# Altium footprint library Hydra_Ref_pcb.PcbLib: 353 footprints (part 20 of 23)
Each footprint in its own frame and in the unit in brackets; x right, y up, seen from the top. Pads: shape width x height; smd on the part's side, far side on the other; paste and mask are expansions set on the pad; w line width, h text height; cw(c..) or ccw(c..) is an arc to the next point about the centre after c.
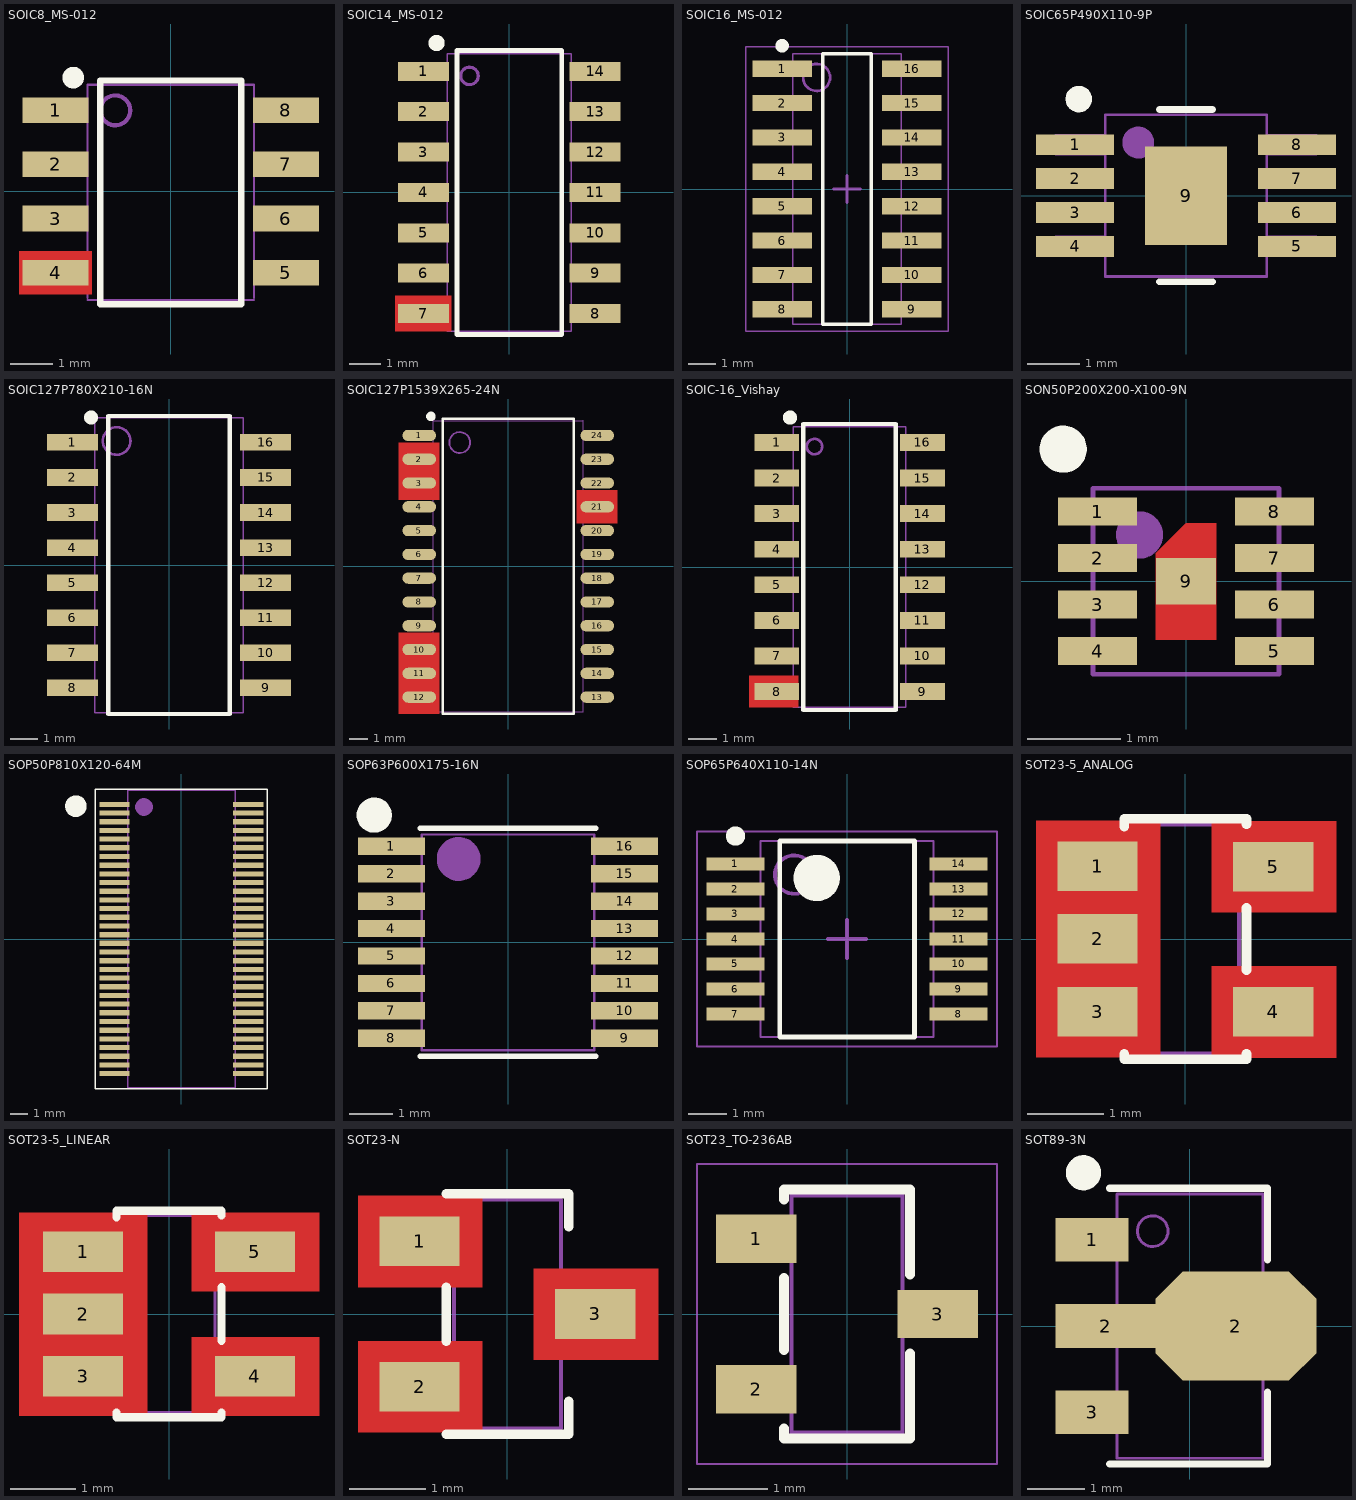
[diagram p19: the footprints below, top view; thin cyan lines are the x and y axes]

## SOIC8_MS-012 [mm] "SOP, 8-Leads, Body 3.9x4.9mm, Pitch 1.27mm, IPC Medium Density"
height 1.8
pads (8):
  rect 1.55x0.6 smd: 1(-2.7,1.905) 2(-2.7,0.635) 3(-2.7,-0.635) 4(-2.7,-1.905) 5(2.7,-1.905) 6(2.7,-0.635) 7(2.7,0.635) 8(2.7,1.905)
Top Layer:
  pour cut-out: -3.556,-2.413 -3.556,-1.397 -1.854,-1.397 -1.854,-2.413
Top Overlay:
  circle w0.254: c-2.286,2.667 r0.127
  lines w0.152: -1.65,-2.647 1.65,-2.647 ; 1.65,-2.6 1.65,2.6 -1.65,2.6 ; -1.65,2.6 -1.65,-2.6 -1.65,2.6
9 Top Assy:
  circle w0.1: c-1.3,1.9 r0.35
  lines w0.051: -1.95,-2.547 1.95,-2.547 ; -1.95,-2.5 -1.95,2.5 1.95,2.5 1.95,-2.5
  text ".Designator" at 0.254,-1.905 h0.76
3D body: height 1.8, standoff 0, extent -1.95,-2.547 1.95,2.5

## SOIC14_MS-012 [mm] "SOP, 14-Leads, Body 3.91x8.65mm, Pitch 1.27mm, IPC Medium Density"
height 1.8
pads (14):
  rect 1.6x0.6 smd: 1(-2.7,3.81) 2(-2.7,2.54) 3(-2.7,1.27) 4(-2.7,0) 5(-2.7,-1.27) 6(-2.7,-2.54) 7(-2.7,-3.81) 8(2.7,-3.81) 9(2.7,-2.54) 10(2.7,-1.27) 11(2.7,0) 12(2.7,1.27) 13(2.7,2.54) 14(2.7,3.81)
Top Layer:
  pour cut-out: -3.581,-4.369 -3.581,-3.251 -1.829,-3.251 -1.829,-4.369
Top Overlay:
  circle w0.254: c-2.286,4.699 r0.127
  lines w0.152: -1.65,-4.465 1.65,-4.465 1.65,4.465 -1.65,4.465 -1.65,-4.465
9 Top Assy:
  circle w0.1: c-1.25,3.665 r0.275
  lines w0.051: -1.95,-4.365 1.95,-4.365 1.95,4.365 -1.95,4.365 -1.95,-4.365
  text ".Designator" at 0.254,-3.429 h0.76
3D body: height 1.8, standoff 0, extent -1.95,-4.365 1.95,4.365

## SOIC16_MS-012 [mm] "SOIC127P600X175-16N, 16-Leads, Body 9.90x3.90mm, Pitch 1.27mm, IPC Medium Density"
height 1.76
pads (16):
  rect 2.2x0.6 smd: 1(-2.4,4.445) 2(-2.4,3.175) 3(-2.4,1.905) 4(-2.4,0.635) 5(-2.4,-0.635) 6(-2.4,-1.905) 7(-2.4,-3.175) 8(-2.4,-4.445) 9(2.4,-4.445) 10(2.4,-3.175) 11(2.4,-1.905) 12(2.4,-0.635) 13(2.4,0.635) 14(2.4,1.905) 15(2.4,3.175) 16(2.4,4.445)
Top Overlay:
  circle w0.25: c-2.4,5.295 r0.125
  lines w0.127: -0.9,-5 0.9,-5 0.9,5 -0.9,5 -0.9,-5
9 Top Assy:
  circle w0.1: c-1.125,4.125 r0.5
  lines w0.051: -2,-5 2,-5 2,5 -2,5 -2,-5
  text ".Designator" at 0.305,-3.734 h0.76
15 Top Optical Placement:
  lines w0.051: -3.75,-5.25 3.75,-5.25 3.75,5.25 -3.75,5.25 -3.75,-5.25
  lines w0.1: -0.5,0 0.5,0 ; 0,-0.5 0,0.5
3D body: height 1.76, standoff 0.1, extent -2,-5 2,5

## SOIC65P490X110-9P [mm] "SOIC, 8+1 Leads, Body 3x3mm (nominal), Pitch .65mm, IPC Medium Density"
height 1.1
pads (9):
  rect 1.498x0.4 smd mask+0.076: 1(-2.125,0.975) 2(-2.125,0.325) 3(-2.125,-0.325) 4(-2.125,-0.975) 5(2.125,-0.975) 6(2.125,-0.325) 7(2.125,0.325) 8(2.125,0.975)
  rect 1.57x1.89 smd mask+0.076: 9(0,0)
Top Overlay:
  circle w0.254: c-2.054,1.85 r0.127
  lines w0.127: -0.508,-1.651 0.508,-1.651 ; -0.508,1.651 0.508,1.651
9 Top Assy:
  circle w0.305: c-0.914,1.016 r0.152
  lines w0.025: -1.803,-0.783 -1.802,-0.783 -1.802,-1.163 ; -1.803,-0.133 -1.802,-0.133 -1.802,-0.513 ; -1.803,0.517 -1.802,0.517 -1.802,0.137 ; -1.803,1.167 -1.802,1.167 -1.802,0.787 ; -1.55,-1.163 -2.502,-1.163 -2.502,-0.783 -1.55,-0.783 ; -1.55,-0.513 -2.502,-0.513 -2.502,-0.133 -1.55,-0.133 ; -1.55,0.137 -2.502,0.137 -2.502,0.517 -1.55,0.517 ; -1.55,0.787 -2.502,0.787 -2.502,1.167 -1.55,1.167 ; 1.55,-1.163 2.502,-1.163 2.502,-0.783 1.55,-0.783 ; 1.55,-0.513 2.502,-0.513 2.502,-0.133 1.55,-0.133 ; 1.55,0.137 2.502,0.137 2.502,0.517 1.55,0.517 ; 1.55,0.787 2.502,0.787 2.502,1.167 1.55,1.167 ; 1.802,-1.163 1.802,-0.783 1.803,-0.783 ; 1.802,-0.513 1.802,-0.133 1.803,-0.133 ; 1.802,0.137 1.802,0.517 1.803,0.517 ; 1.802,0.787 1.802,1.167 1.803,1.167
  lines w0.05: -1.55,-1.55 1.55,-1.55 1.55,1.55 -1.55,1.55 -1.55,-1.55
  text ".Designator" at 0.381,-1.397 h0.64
3D body: height 1, standoff 0.15, extent -1.551,-1.55 1.567,1.55

## SOIC127P780X210-16N [mm] "SOP, 16-Leads, Body 10.1x5.3mm, Pitch 1.27mm, IPC Medium Density    SOP, 16-Leads, Body 10.1x5.3mm, Pitch 1.27mm, IPC Medium Density"
height 2.1
pads (16):
  rect 1.85x0.6 smd: 1(-3.5,4.445) 2(-3.5,3.175) 3(-3.5,1.905) 4(-3.5,0.635) 5(-3.5,-0.635) 6(-3.5,-1.905) 7(-3.5,-3.175) 8(-3.5,-4.445) 9(3.5,-4.445) 10(3.5,-3.175) 11(3.5,-1.905) 12(3.5,-0.635) 13(3.5,0.635) 14(3.5,1.905) 15(3.5,3.175) 16(3.5,4.445)
Top Overlay:
  circle w0.254: c-2.827,5.35 r0.127
  lines w0.152: -2.2,-5.4 -2.2,5.4 2.2,5.4 2.2,-5.4 -2.2,-5.4
9 Top Assy:
  circle w0.1: c-1.9,4.5 r0.5
  lines w0.051: -2.7,-5.35 -2.7,5.35 2.7,5.35 2.7,-5.35 -2.7,-5.35
  text ".Designator" at 0.127,-3.556 h0.76
13 Top 3D Bodies:
  lines w0.051: -2.7,-5.35 -2.7,5.35 2.7,5.35 2.7,-5.35 -2.7,-5.35
3D body: height 2.11, standoff 0, extent -2.7,-5.35 2.7,5.35

## SOIC127P1539X265-24N [mm] "SOP, 16-Leads, Body 10.1x5.3mm, Pitch 1.27mm, IPC Medium Density    SOP, 24-Leads, Body 15.39x7.5x2.65mm, Pitch 1.27mm, IPC Medium Density"
height 2.65
pads (24):
  oval 1.8x0.6 smd: 1(-4.75,6.985) 2(-4.75,5.715) 3(-4.75,4.445) 4(-4.75,3.175) 5(-4.75,1.905) 6(-4.75,0.635) 7(-4.75,-0.635) 8(-4.75,-1.905) 9(-4.75,-3.175) 10(-4.75,-4.445) 11(-4.75,-5.715) 12(-4.75,-6.985) 13(4.75,-6.985) 14(4.75,-5.715) 15(4.75,-4.445) 16(4.75,-3.175) 17(4.75,-1.905) 18(4.75,-0.635) 19(4.75,0.635) 20(4.75,1.905) 21(4.75,3.175) 22(4.75,4.445) 23(4.75,5.715) 24(4.75,6.985)
Top Layer:
  pour cut-out: -5.842,6.604 -3.683,6.604 -3.683,3.556 -5.842,3.556
  pour cut-out: 3.658,4.064 5.817,4.064 5.817,2.286 3.658,2.286
  pour cut-out: -5.842,-3.556 -3.683,-3.556 -3.683,-7.874 -5.842,-7.874
Top Overlay:
  circle w0.254: c-4.127,8.001 r0.127
  lines w0.127: -3.5,-7.862 3.5,-7.862 3.5,7.873 -3.5,7.873 -3.5,-7.862
9 Top Assy:
  circle w0.1: c-2.588,6.604 r0.556
  lines w0.051: -4,-7.78 -4,7.782 ; -4,-7.772 4,-7.772 ; -4,7.772 4,7.772 ; 4,-7.78 4,7.782
  text ".Designator" at -2.818,-0.638 h1.65
3D body: height 2.65, standoff 0, extent -4,-7.78 4,7.782

## SOIC-16_Vishay [mm] "SOP, 16-Leads, Vishay"
height 1.75
pads (16):
  rect 1.6x0.6 smd: 1(-2.6,4.445) 2(-2.6,3.175) 3(-2.6,1.905) 4(-2.6,0.635) 5(-2.6,-0.635) 6(-2.6,-1.905) 7(-2.6,-3.175) 8(-2.6,-4.445) 9(2.6,-4.445) 10(2.6,-3.175) 11(2.6,-1.905) 12(2.6,-0.635) 13(2.6,0.635) 14(2.6,1.905) 15(2.6,3.175) 16(2.6,4.445)
Top Layer:
  pour cut-out: -3.581,-5.004 -3.581,-3.886 -1.829,-3.886 -1.829,-5.004
Top Overlay:
  circle w0.254: c-2.127,5.334 r0.127
  lines w0.152: -1.65,-5.1 1.65,-5.1 1.65,5.1 -1.65,5.1 -1.65,-5.1
9 Top Assy:
  circle w0.1: c-1.25,4.3 r0.275
  lines w0.051: -2.2,-4.195 -2.175,-4.195 -2.175,-4.696 -3.1,-4.696 ; -2.175,-3.426 -2.175,-2.925 ; -2.175,-2.156 -2.175,-1.655 ; -2.175,-0.886 -2.175,-0.385 ; -2.175,0.384 -2.175,0.885 ; -2.175,1.654 -2.175,2.155 ; -2.175,2.924 -2.175,3.425 ; -2.175,4.194 -2.175,4.695 ; -2,-4.696 -3.1,-4.696 ; -2,-4.195 -3.1,-4.195 -3.1,-4.696 ; -2,-3.426 -3.1,-3.426 -3.1,-2.925 -2,-2.925 ; -2,-2.156 -3.1,-2.156 -3.1,-1.655 -2,-1.655 ; -2,-0.886 -3.1,-0.886 -3.1,-0.385 -2,-0.385 ; -2,0.384 -3.1,0.384 -3.1,0.885 -2,0.885 ; -2,1.654 -3.1,1.654 -3.1,2.155 -2,2.155 ; -2,2.924 -3.1,2.924 -3.1,3.425 -2,3.425 ; -2,4.194 -3.1,4.194 -3.1,4.695 -2,4.695 ; 2,-4.696 3.1,-4.696 3.1,-4.195 2,-4.195 ; 2,-3.426 3.1,-3.426 3.1,-2.925 2,-2.925 ; 2,-2.156 3.1,-2.156 3.1,-1.655 2,-1.655 ; 2,-0.886 3.1,-0.886 3.1,-0.385 2,-0.385 ; 2,0.384 3.1,0.384 3.1,0.885 2,0.885 ; 2,1.654 3.1,1.654 3.1,2.155 2,2.155 ; 2,2.924 3.1,2.924 3.1,3.425 2,3.425 ; 2,4.194 3.1,4.194 3.1,4.695 2,4.695 ; 2.175,-4.696 2.175,-4.195 ; 2.175,-3.426 2.175,-2.925 ; 2.175,-2.156 2.175,-1.655 ; 2.175,-0.886 2.175,-0.385 ; 2.175,0.384 2.175,0.885 ; 2.175,1.654 2.175,2.155 ; 2.175,2.924 2.175,3.425 ; 2.175,4.194 2.175,4.695 ; -2,-5 2,-5 2,5 -2,5 -2,-5
  text ".Designator" at 0.254,-3.886 h0.76
3D body: height 1.75, standoff 0, extent -2,-5.018 2,5

## SON50P200X200-X100-9N [mm] "SON 8+1 Leads, Body 2x2mm (nominal), Pitch .0.50mm, IPC Medium Density"
height 1.1
pads (9):
  rect 0.85x0.3 smd mask+0.102: 1(-0.95,0.75) 2(-0.95,0.25) 3(-0.95,-0.25) 4(-0.95,-0.75) 5(0.95,-0.75) 6(0.95,-0.25) 7(0.95,0.25) 8(0.95,0.75)
  rect 0.65x0.5 smd mask+0.102: 9(0,0)
Top Layer:
  region: -0.325,-0.625 0.325,-0.625 0.325,0.625 -0.005,0.625 -0.325,0.305
Top Overlay:
  circle w0.254: c-1.321,1.422 r0.127
Top Paste:
  region: -0.325,-0.625 0.325,-0.625 0.325,0.625 -0.005,0.625 -0.325,0.305
Top Solder:
  pour cut-out: -1.613,1.156 -1.613,-1.156 1.613,-1.156 1.613,1.156
  region: -0.425,-0.73 0.425,-0.73 0.425,0.725 -0.045,0.725 -0.425,0.345
9 Top Assy:
  circle w0.254: c-0.5,0.5 r0.127
  lines w0.05: -1,-1 1,-1 1,1 -1,1 -1,-1
  text ".Designator" at -0.354,-0.734 h0.51
3D body: height 1, standoff 0.15, extent -1.653,-1.35 1.65,1.35

## SOP50P810X120-64M [mm] "SOP, 64-Leads, Body 17.1x6.2mm (max), Pitch 0.50mm"
height 1.2
pads (64):
  rect 1.75x0.3 smd: 1(-3.85,7.75) 2(-3.85,7.25) 3(-3.85,6.75) 4(-3.85,6.25) 5(-3.85,5.75) 6(-3.85,5.25) 7(-3.85,4.75) 8(-3.85,4.25) 9(-3.85,3.75) 10(-3.85,3.25) 11(-3.85,2.75) 12(-3.85,2.25) 13(-3.85,1.75) 14(-3.85,1.25) 15(-3.85,0.75) 16(-3.85,0.25) 17(-3.85,-0.25) 18(-3.85,-0.75) 19(-3.85,-1.25) 20(-3.85,-1.75) 21(-3.85,-2.25) 22(-3.85,-2.75) 23(-3.85,-3.25) 24(-3.85,-3.75) 25(-3.85,-4.25) 26(-3.85,-4.75) 27(-3.85,-5.25) 28(-3.85,-5.75) 29(-3.85,-6.25) 30(-3.85,-6.75) 31(-3.85,-7.25) 32(-3.85,-7.75) 33(3.85,-7.75) 34(3.85,-7.25) 35(3.85,-6.75) 36(3.85,-6.25) 37(3.85,-5.75) 38(3.85,-5.25) 39(3.85,-4.75) 40(3.85,-4.25) 41(3.85,-3.75) 42(3.85,-3.25) 43(3.85,-2.75) 44(3.85,-2.25) 45(3.85,-1.75) 46(3.85,-1.25) 47(3.85,-0.75) 48(3.85,-0.25) 49(3.85,0.25) 50(3.85,0.75) 51(3.85,1.25) 52(3.85,1.75) 53(3.85,2.25) 54(3.85,2.75) 55(3.85,3.25) 56(3.85,3.75) 57(3.85,4.25) 58(3.85,4.75) 59(3.85,5.25) 60(3.85,5.75) 61(3.85,6.25) 62(3.85,6.75) 63(3.85,7.25) 64(3.85,7.75)
Top Overlay:
  circle w0.635: c-6.071,7.645 r0.305
  lines w0.076: -4.953,-8.636 -4.953,8.636 4.953,8.636 4.953,-8.636 -4.953,-8.636
9 Top Assy:
  circle w0.508: c-2.15,7.6 r0.254
  lines w0.076: -3.1,-8.55 -3.1,8.55 3.1,8.55 3.1,-8.55 -3.1,-8.55
  text ".Designator" at -1.858,-1.593 h1.27
3D body: height 1.2, standoff 0, extent -3.099,-8.549 3.099,8.549

## SOP63P600X175-16N [mm] "16-Pin Plastic SSOP 0.635mm Pitch, IPC Nom. Density"
height 1.753
pads (16):
  rect 1.55x0.4 smd: 1(-2.7,2.222) 2(-2.7,1.587) 3(-2.7,0.953) 4(-2.7,0.318) 5(-2.7,-0.318) 6(-2.7,-0.953) 7(-2.7,-1.587) 8(-2.7,-2.222) 9(2.7,-2.222) 10(2.7,-1.587) 11(2.7,-0.953) 12(2.7,-0.318) 13(2.7,0.318) 14(2.7,0.953) 15(2.7,1.587) 16(2.7,2.222)
Top Overlay:
  circle w0.406: c-3.099,2.946 r0.203
  lines w0.127: -2.032,-2.642 2.032,-2.642 ; -2.032,2.642 2.032,2.642
9 Top Assy:
  circle w0.508: c-1.143,1.93 r0.254
  lines w0.051: -2,-2.5 2,-2.5 2,2.5 -2,2.5 -2,-2.5
  text ".Designator" at -1.434,-1.044 h1.02
3D body: height 1.75, standoff 0, extent -2.005,-2.494 2.012,2.504
3D body: height 0, standoff 0, extent -3.75,-2.8 3.75,2.8

## SOP65P640X110-14N [mm] "TSOP65P640X120-14N, 14-Leads, Body 5.00x4.40mm, Pitch 0.65mm, IPC Medium Density"
height 1.2
pads (14):
  rect 1.5x0.35 smd: 1(-2.9,1.95) 2(-2.9,1.3) 3(-2.9,0.65) 4(-2.9,0) 5(-2.9,-0.65) 6(-2.9,-1.3) 7(-2.9,-1.95) 8(2.9,-1.95) 9(2.9,-1.3) 10(2.9,-0.65) 11(2.9,0) 12(2.9,0.65) 13(2.9,1.3) 14(2.9,1.95)
Top Overlay:
  circle w0.25: c-2.9,2.675 r0.125
  circle w0.6: c-0.786,1.587 r0.3
  lines w0.127: -1.75,-2.55 -1.75,2.55 1.75,2.55 1.75,-2.55 -1.75,-2.55
9 Top Assy:
  circle w0.1: c-1.374,1.675 r0.5
  lines w0.051: -2.25,-2.55 -2.25,2.55 2.25,2.55 2.25,-2.55 -2.25,-2.55
  text ".Designator" at 1.118,-2.337 h1.3
15 Top Optical Placement:
  lines w0.051: -3.9,-2.8 -3.9,2.8 3.9,2.8 3.9,-2.8 -3.9,-2.8
  lines w0.1: -0.5,0 0.5,0 ; 0,-0.5 0,0.5
3D body: height 1.2, standoff 0.05, extent -2.25,-2.55 2.25,2.55

## SOT23-5_ANALOG [mm]
height 1.45
pads (5):
  rect 1.05x0.65 smd mask+0.076: 1(-1.15,0.95) 2(-1.15,0.002) 3(-1.15,-0.95) 4(1.15,-0.952) 5(1.15,0.948)
Top Layer:
  pour cut-out: 1.97,-0.358 1.97,-1.552 0.344,-1.552 0.344,-0.358
  pour cut-out: 1.97,1.542 1.97,0.348 0.344,0.348 0.344,1.542
  pour cut-out: -0.33,1.544 -0.33,-1.549 -1.956,-1.549 -1.956,1.544
Top Overlay:
  lines w0.127: -0.8,-1.5 -0.8,-1.575 0.8,-1.575 0.8,-1.5 ; -0.8,1.473 -0.8,1.575 0.8,1.575 0.8,1.5 ; 0.8,-0.406 0.8,0.406
9 Top Assy:
  lines w0.051: -0.889,-1.206 -0.889,-0.698 ; -0.889,-0.249 -0.889,0.259 ; -0.889,0.699 -0.889,1.207 ; -0.7,-1.206 -1.143,-1.206 -1.143,-0.698 -0.7,-0.698 ; -0.7,-0.249 -1.143,-0.249 -1.143,0.259 -0.7,0.259 ; -0.7,0.699 -1.143,0.699 -1.143,1.207 -0.7,1.207 ; 0.7,-1.204 1.143,-1.204 1.143,-0.696 0.7,-0.696 ; 0.7,0.696 1.143,0.696 1.143,1.204 0.7,1.204 ; 0.889,-1.204 0.889,-0.696 ; 0.889,0.696 0.889,1.204 ; -0.7,-1.5 -0.7,1.5 0.7,1.5 0.7,-1.5 -0.7,-1.5
  text ".Designator" at 0.305,-1.27 h0.64
3D body: height 1.45, standoff 0, extent -0.7,-1.5 0.7,1.5

## SOT23-5_LINEAR [mm]
height 1.45
pads (5):
  rect 1.22x0.62 smd mask+0.076: 1(-1.31,0.95) 2(-1.31,0) 3(-1.31,-0.95) 4(1.31,-0.95) 5(1.31,0.95)
Top Layer:
  pour cut-out: 2.286,-0.358 2.286,-1.552 0.344,-1.552 0.344,-0.358
  pour cut-out: 2.286,1.542 2.286,0.348 0.344,0.348 0.344,1.542
  pour cut-out: -0.33,1.544 -0.33,-1.549 -2.286,-1.549 -2.286,1.544
Top Overlay:
  lines w0.127: -0.8,-1.5 -0.8,-1.575 0.8,-1.575 0.8,-1.5 ; -0.8,1.473 -0.8,1.575 0.8,1.575 0.8,1.5 ; 0.8,-0.406 0.8,0.406
9 Top Assy:
  lines w0.051: -0.889,-1.206 -0.889,-0.698 ; -0.889,-0.249 -0.889,0.259 ; -0.889,0.699 -0.889,1.207 ; -0.7,-1.206 -1.143,-1.206 -1.143,-0.698 -0.7,-0.698 ; -0.7,-0.249 -1.143,-0.249 -1.143,0.259 -0.7,0.259 ; -0.7,0.699 -1.143,0.699 -1.143,1.207 -0.7,1.207 ; 0.7,-1.204 1.143,-1.204 1.143,-0.696 0.7,-0.696 ; 0.7,0.696 1.143,0.696 1.143,1.204 0.7,1.204 ; 0.889,-1.204 0.889,-0.696 ; 0.889,0.696 0.889,1.204 ; -0.7,-1.5 -0.7,1.5 0.7,1.5 0.7,-1.5 -0.7,-1.5
  text ".Designator" at 0.305,-1.27 h0.64
3D body: height 1.45, standoff 0, extent -0.7,-1.5 0.7,1.5

## SOT23-N [mm] ".95mm PITCH 1.3mmW 2.9mmL 1.1mmH"
height 1.3
pads (3):
  rect 1.05x0.65 smd mask+0.076: 1(-1.15,0.95) 2(-1.15,-0.95) 3(1.15,0)
Top Layer:
  pour cut-out: 1.97,0.594 1.97,-0.599 0.344,-0.599 0.344,0.594
  pour cut-out: -0.33,1.544 -0.33,0.351 -1.956,0.351 -1.956,1.544
  pour cut-out: -0.33,-0.356 -0.33,-1.549 -1.956,-1.549 -1.956,-0.356
Top Overlay:
  lines w0.127: -0.8,-1.575 0.8,-1.575 0.8,-1.143 ; -0.8,-0.356 -0.8,0.351 ; -0.8,1.575 0.8,1.575 0.8,1.143
9 Top Assy:
  lines w0.051: -0.889,-1.206 -0.889,-0.698 ; -0.889,0.699 -0.889,1.207 ; -0.7,-1.206 -1.143,-1.206 -1.143,-0.698 -0.7,-0.698 ; -0.7,0.699 -1.143,0.699 -1.143,1.207 -0.7,1.207 ; 0.7,-0.252 1.143,-0.252 ; 0.7,0.256 1.143,0.256 ; 0.889,-0.254 0.889,0.254 ; 1.143,-0.254 1.143,0.254 ; -0.7,-1.5 -0.7,1.5 0.7,1.5 0.7,-1.5 -0.7,-1.5
  text ".Designator" at 0.4,-1.3 h0.76
3D body: height 1.3, standoff 0, extent -0.7,-1.5 0.8,1.5

## SOT23_TO-236AB [mil] "CASE 318-08"
height 44
pads (3):
  rect 40x24 smd mask+3: 1(-45.28,37.5) 2(-45.28,-37.5) 3(45.28,0)
Top Overlay:
  lines w5: -31.5,-57 -31.5,-62 31.5,-62 31.5,-19.68 ; -31.5,-18 -31.5,18 ; -31.5,57 -31.5,62 31.5,62 31.5,19.68
9 Top Assy:
  lines w2: -35,-47.5 -35,-27.5 ; -35,27.5 -35,47.5 ; -27.56,-47.5 -45,-47.5 -45,-27.5 -27.56,-27.5 ; -27.56,27.5 -45,27.5 -45,47.5 -27.56,47.5 ; 27.56,-9.94 45,-9.94 ; 27.56,10.06 45,10.06 ; 35,-10 35,10 ; 45,-10 45,10 ; -27.56,-59.06 27.56,-59.06 27.56,59.06 -27.56,59.06 -27.56,-59.06
  text ".Designator" at 15.75,-51.18 h30
13 Top 3D Bodies:
  lines w1: -74.8,-74.8 74.8,-74.8 74.8,74.8 -74.8,74.8 -74.8,-74.8
3D body: height 44, standoff 0, extent -75,-75 75,75

## SOT89-3N [mm] "SOT89, 3-Leads, Body 4.5x2.5x1.6mm, Pitch 1.5mm"
height 1.6
pads (4):
  rect 1.27x0.762 smd: 1(-1.7,1.5) 3(-1.7,-1.5)
  rect 1.753x0.762 smd: 2(-1.46,0)
  oct 2.8x1.9 smd: 2(0.8,0)
Top Overlay:
  circle w0.305: c-1.852,2.667 r0.152
  lines w0.127: -1.4,-2.4 1.35,-2.4 1.35,-1.15 ; -1.4,2.4 1.35,2.4 1.35,1.15
9 Top Assy:
  circle w0.051: c-0.648,1.651 r0.267
  lines w0.051: -1.27,-1.75 -2.1,-1.75 -2.1,-1.25 -1.27,-1.25 ; -1.27,-0.25 -2.1,-0.25 -2.1,0.25 -1.27,0.25 ; -1.27,1.25 -2.1,1.25 -2.1,1.75 -1.27,1.75 ; 1.27,-0.8 1.594,-0.8 1.886,-0.508 1.886,0.508 1.594,0.8 1.27,0.8 ; -1.27,-2.3 -1.27,2.3 1.27,2.3 1.27,-2.3 -1.27,-2.3
  text ".Designator" at 0.279,-0.94 h0.64
3D body: height 1.6, standoff 0, extent -1.27,-2.3 1.27,2.3